# Altium footprint library chicken.PcbLib: 19 footprints (part 1 of 2)
Each footprint in its own frame and in the unit in brackets; x right, y up, seen from the top. Pads: shape width x height; smd on the part's side, far side on the other; paste and mask are expansions set on the pad; w line width, h text height; cw(c..) or ccw(c..) is an arc to the next point about the centre after c.
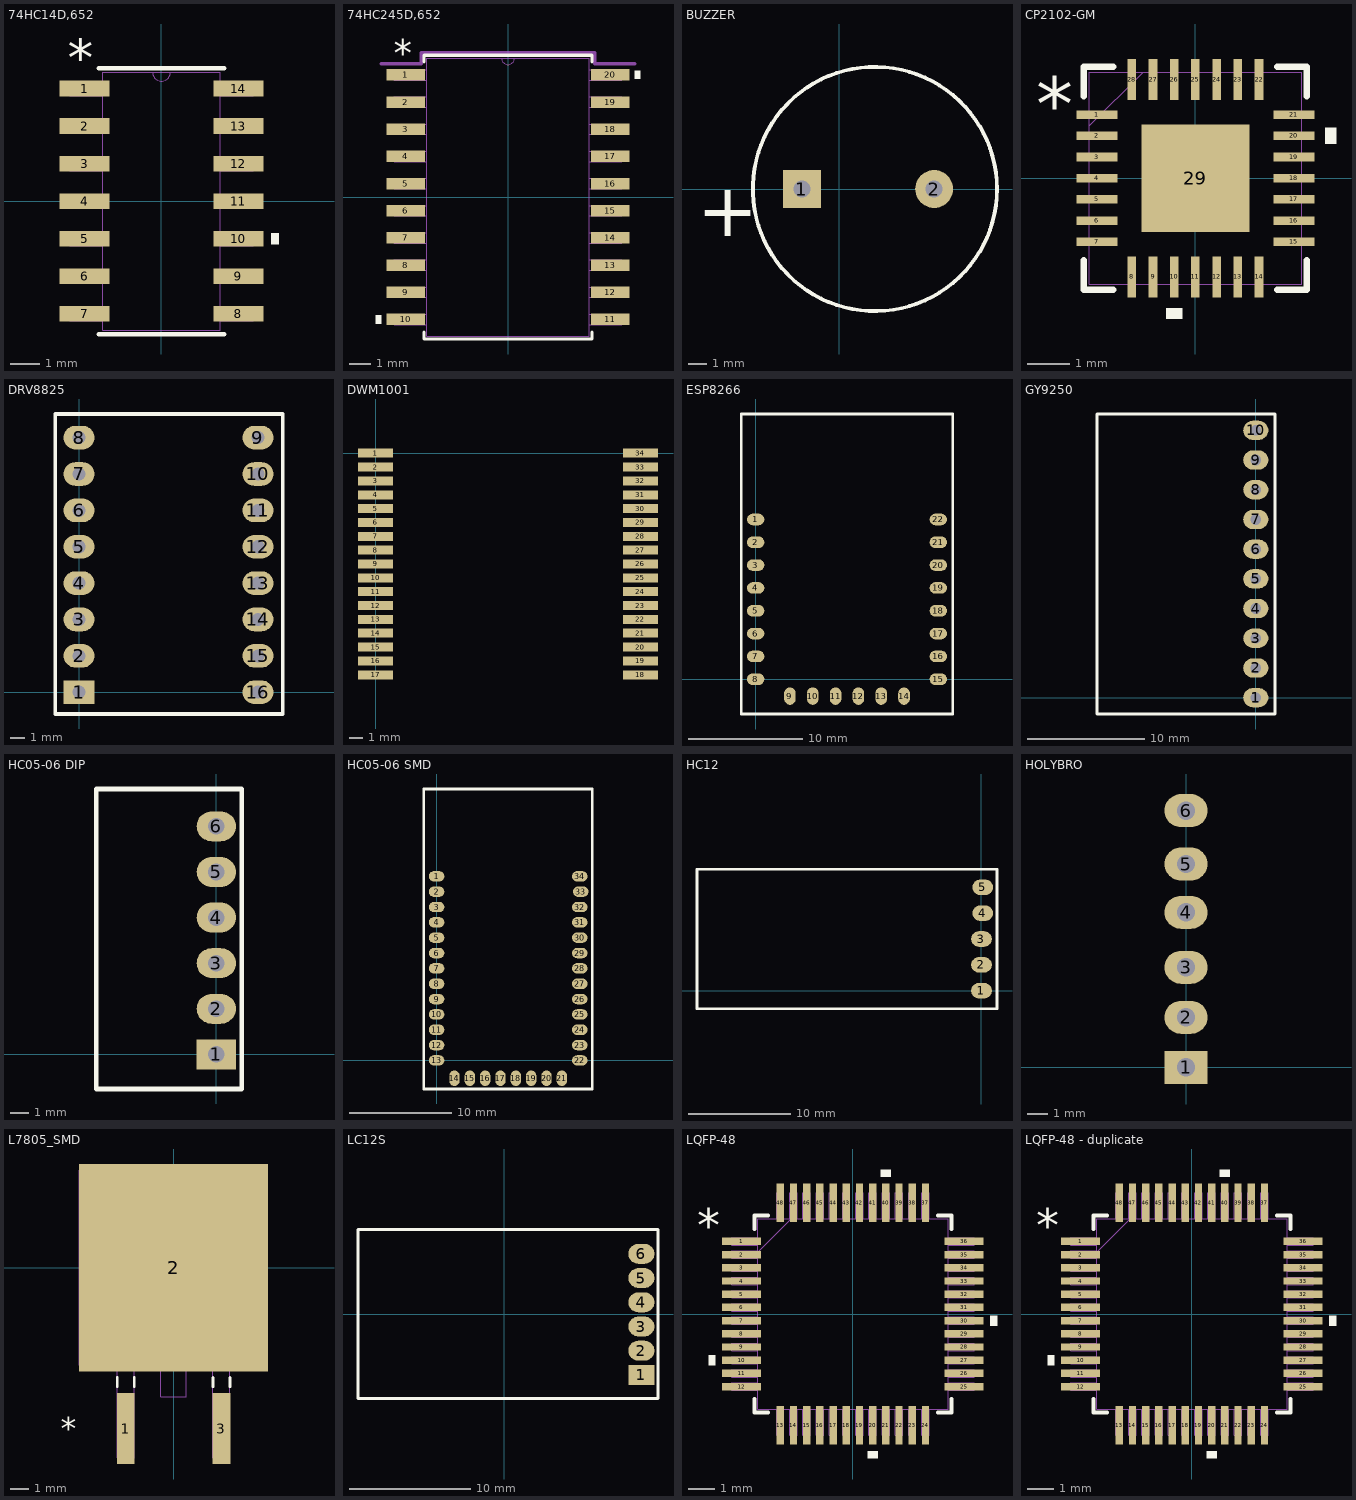
[diagram p0: the footprints below, top view; thin cyan lines are the x and y axes]

## 74HC14D,652 [mil]
pads (14):
  rect 67x21 smd paste+0 mask+0: 1(-102.5,150) 2(-102.5,100) 3(-102.5,50) 4(-102.5,0) 5(-102.5,-50) 6(-102.5,-100) 7(-102.5,-150) 8(102.5,-150) 9(102.5,-100) 10(102.5,-50) 11(102.5,0) 12(102.5,50) 13(102.5,100) 14(102.5,150)
Top Overlay:
  region: 146,-42.5 156,-42.5 156,-57.5 146,-57.5
  lines w6: -83.5,-177 83.5,-177 ; -83.5,177 83.5,177
  text "*" at -125,166 h50
Mechanical 13:
  lines w0: -12,172 ccw(c0,172) 12,172
  lines w1: -122,-159.5 -78.5,-159.5 -78.5,-140.5 -122,-140.5 -122,-159.5 ; -122,-109.5 -78.5,-109.5 -78.5,-90.5 -122,-90.5 -122,-109.5 ; -122,-59.5 -78.5,-59.5 -78.5,-40.5 -122,-40.5 -122,-59.5 ; -122,-9.5 -78.5,-9.5 -78.5,9.5 -122,9.5 -122,-9.5 ; -122,40.5 -78.5,40.5 -78.5,59.5 -122,59.5 -122,40.5 ; -122,90.5 -78.5,90.5 -78.5,109.5 -122,109.5 -122,90.5 ; -122,140.5 -78.5,140.5 -78.5,159.5 -122,159.5 -122,140.5 ; -78.5,-172 -78.5,172 78.5,172 78.5,-172 -78.5,-172 ; 78.5,-159.5 122,-159.5 122,-140.5 78.5,-140.5 78.5,-159.5 ; 78.5,-109.5 122,-109.5 122,-90.5 78.5,-90.5 78.5,-109.5 ; 78.5,-59.5 122,-59.5 122,-40.5 78.5,-40.5 78.5,-59.5 ; 78.5,-9.5 122,-9.5 122,9.5 78.5,9.5 78.5,-9.5 ; 78.5,40.5 122,40.5 122,59.5 78.5,59.5 78.5,40.5 ; 78.5,90.5 122,90.5 122,109.5 78.5,109.5 78.5,90.5 ; 78.5,140.5 122,140.5 122,159.5 78.5,159.5 78.5,140.5
  text "*" at -76,119 h50
3D body: height 10, standoff 0, extent 0,0 10,10
3D body "SOT108-1_NEX.step": height 69.09, standoff 0, extent -124.01,-172.01 120,172.01

## 74HC245D,652 [mil]
pads (20):
  rect 71x21 smd paste+0 mask+0: 1(-188,225) 2(-188,175) 3(-188,125) 4(-188,75) 5(-188,25) 6(-188,-25) 7(-188,-75) 8(-188,-125) 9(-188,-175) 10(-188,-225) 11(188,-225) 12(188,-175) 13(188,-125) 14(188,-75) 15(188,-25) 16(188,25) 17(188,75) 18(188,125) 19(188,175) 20(188,225)
Top Overlay:
  region: 233.5,232.5 243.5,232.5 243.5,217.5 233.5,217.5
  region: -233.5,-217.5 -243.5,-217.5 -243.5,-232.5 -233.5,-232.5
  lines w6: -154.5,-248.6 -154.5,-261 154.5,-261 154.5,-248.6 ; -154.5,248.6 -154.5,261 154.5,261 154.5,248.6
  text "*" at -210.5,241 h50
Mechanical 13:
  lines w0: -12,256 ccw(c0,256) 12,256
  lines w1: -209.5,-234.5 -149.5,-234.5 -149.5,-215.5 -209.5,-215.5 -209.5,-234.5 ; -209.5,-184.5 -149.5,-184.5 -149.5,-165.5 -209.5,-165.5 -209.5,-184.5 ; -209.5,-134.5 -149.5,-134.5 -149.5,-115.5 -209.5,-115.5 -209.5,-134.5 ; -209.5,-84.5 -149.5,-84.5 -149.5,-65.5 -209.5,-65.5 -209.5,-84.5 ; -209.5,-34.5 -149.5,-34.5 -149.5,-15.5 -209.5,-15.5 -209.5,-34.5 ; -209.5,15.5 -149.5,15.5 -149.5,34.5 -209.5,34.5 -209.5,15.5 ; -209.5,65.5 -149.5,65.5 -149.5,84.5 -209.5,84.5 -209.5,65.5 ; -209.5,115.5 -149.5,115.5 -149.5,134.5 -209.5,134.5 -209.5,115.5 ; -209.5,165.5 -149.5,165.5 -149.5,184.5 -209.5,184.5 -209.5,165.5 ; -209.5,215.5 -149.5,215.5 -149.5,234.5 -209.5,234.5 -209.5,215.5 ; -149.5,-256 -149.5,256 149.5,256 149.5,-256 -149.5,-256 ; 149.5,-234.5 209.5,-234.5 209.5,-215.5 149.5,-215.5 149.5,-234.5 ; 149.5,-184.5 209.5,-184.5 209.5,-165.5 149.5,-165.5 149.5,-184.5 ; 149.5,-134.5 209.5,-134.5 209.5,-115.5 149.5,-115.5 149.5,-134.5 ; 149.5,-84.5 209.5,-84.5 209.5,-65.5 149.5,-65.5 149.5,-84.5 ; 149.5,-34.5 209.5,-34.5 209.5,-15.5 149.5,-15.5 149.5,-34.5 ; 149.5,15.5 209.5,15.5 209.5,34.5 149.5,34.5 149.5,15.5 ; 149.5,65.5 209.5,65.5 209.5,84.5 149.5,84.5 149.5,65.5 ; 149.5,115.5 209.5,115.5 209.5,134.5 149.5,134.5 149.5,115.5 ; 149.5,165.5 209.5,165.5 209.5,184.5 149.5,184.5 149.5,165.5 ; 149.5,215.5 209.5,215.5 209.5,234.5 149.5,234.5 149.5,215.5
  text "*" at -147,203 h50
Mechanical 15:
  lines w6: -233.5,245.5 -159.5,245.5 -159.5,266 159.5,266 159.5,245.5 233.5,245.5
3D body: height 10, standoff 0, extent 0,0 10,10
3D body "SOT163-1_NEX.step": height 104.09, standoff 0, extent -209.48,-255.98 209.5,255.99

## BUZZER [mil]
pads (2):
  rect 80x80 hole 36: 1(-78.73,0)
  round 80 hole 36: 2(200,0)
Top Overlay:
  circle w8: c75,0 r257.39
  text ".Designator" at -39.55,-145.62 h45
  text "+" at -300,-100 h112.5
3D body "Buzzer.step": height 334.65, standoff -216.54, extent -176.22,-237.44 296.22,235

## CP2102-GM [mil]
pads (29):
  rect 38x8 smd paste+0 mask+0: 1(-91.5,59.06) 2(-91.5,39.37) 3(-91.5,19.68) 4(-91.5,0) 5(-91.5,-19.68) 6(-91.5,-39.37) 7(-91.5,-59.06) 15(91.5,-59.06) 16(91.5,-39.37) 17(91.5,-19.68) 18(91.5,0) 19(91.5,19.68) 20(91.5,39.37) 21(91.5,59.06)
  rect 8x38 smd paste+0 mask+0: 8(-59.06,-91.5) 9(-39.37,-91.5) 10(-19.68,-91.5) 11(0,-91.5) 12(19.68,-91.5) 13(39.37,-91.5) 14(59.06,-91.5) 22(59.06,91.5) 23(39.37,91.5) 24(19.68,91.5) 25(0,91.5) 26(-19.68,91.5) 27(-39.37,91.5) 28(-59.06,91.5)
  rect 100x100 smd paste-65.5 mask+0: 29(0,0)
Top Overlay:
  region: -12.19,-120.5 -27.18,-120.5 -27.18,-130.5 -12.19,-130.5
  region: 120.5,46.87 130.5,46.87 130.5,31.87 120.5,31.87
  lines w6: -103.5,-76.16 -103.5,-103.5 -76.16,-103.5 ; -103.5,76.16 -103.5,103.5 -76.16,103.5 ; 76.16,-103.5 103.5,-103.5 103.5,-76.16 ; 76.16,103.5 103.5,103.5 103.5,76.16
  text "*" at -148,43.9 h50
Top Paste:
  region: -3.94,50 -50,50 -50,3.94 -3.94,3.94
  region: -3.94,-3.94 -50,-3.94 -50,-50 -3.94,-50
  region: 50,50 3.94,50 3.94,3.94 50,3.94
  region: 50,-3.94 3.94,-3.94 3.94,-50 50,-50
Mechanical 13:
  lines w1: -98.5,48.5 -48.5,98.5 ; -98.5,-98.5 98.5,-98.5 98.5,98.5 -98.5,98.5 -98.5,-98.5 ; -98.5,-65.06 -98.5,-53.06 -98.5,-65.06 ; -98.5,-45.37 -98.5,-33.37 -98.5,-45.37 ; -98.5,-25.68 -98.5,-13.69 -98.5,-25.68 ; -98.5,-6 -98.5,6 -98.5,-6 ; -98.5,13.69 -98.5,25.68 -98.5,13.69 ; -98.5,33.37 -98.5,45.37 -98.5,33.37 ; -98.5,53.06 -98.5,65.06 -98.5,53.06 ; -65.06,-98.5 -53.06,-98.5 -65.06,-98.5 ; -65.06,98.5 -53.06,98.5 -65.06,98.5 ; -45.37,-98.5 -33.37,-98.5 -45.37,-98.5 ; -45.37,98.5 -33.37,98.5 -45.37,98.5 ; -25.68,-98.5 -13.69,-98.5 -25.68,-98.5 ; -25.68,98.5 -13.69,98.5 -25.68,98.5 ; -6,-98.5 6,-98.5 -6,-98.5 ; -6,98.5 6,98.5 -6,98.5 ; 13.69,-98.5 25.68,-98.5 13.69,-98.5 ; 13.69,98.5 25.68,98.5 13.69,98.5 ; 33.37,-98.5 45.37,-98.5 33.37,-98.5 ; 33.37,98.5 45.37,98.5 33.37,98.5 ; 53.06,-98.5 65.06,-98.5 53.06,-98.5 ; 53.06,98.5 65.06,98.5 53.06,98.5 ; 98.5,-65.06 98.5,-53.06 98.5,-65.06 ; 98.5,-45.37 98.5,-33.37 98.5,-45.37 ; 98.5,-25.68 98.5,-13.69 98.5,-25.68 ; 98.5,-6 98.5,6 98.5,-6 ; 98.5,13.69 98.5,25.68 98.5,13.69 ; 98.5,33.37 98.5,45.37 98.5,33.37 ; 98.5,53.06 98.5,65.06 98.5,53.06
  text "*" at -85,43.9 h50
3D body "QFN28_5X5_SIL.step": height 37.09, standoff 0, extent -98.5,-98.5 98.51,98.51
3D body: height 10, standoff 0, extent 0,0 10,10

## DRV8825 [mil]
pads (16):
  rect 85x65 hole 36: 1(0,0)
  oval 85x65 hole 36: 2(0,100) 3(0,200) 4(0,300) 5(0,400) 6(0,500) 7(0,600) 8(0,700) 9(492.13,700) 10(492.13,600) 11(492.13,500) 12(492.13,400) 13(492.13,300) 14(492.13,200) 15(492.13,100) 16(492.13,0)
Top Overlay:
  lines w10: -65,-60 560,-60 560,765 -65,765 -65,-60
3D body "Driver DRV8825.stp": height 500, standoff -80.46, extent -50.27,-47.36 540.28,752.64

## DWM1001 [mm]
pads (34):
  rect 2.54x0.65 smd: 1(0,0) 2(0,-1) 3(0,-2) 4(0,-3) 5(0,-4) 6(0,-5) 7(0,-6) 8(0,-7) 9(0,-8) 10(0,-9) 11(0,-10) 12(0,-11) 13(0,-12) 14(0,-13) 15(0,-14) 16(0,-15) 17(0,-16) 18(19.13,-16) 19(19.13,-15) 20(19.13,-14) 21(19.13,-13) 22(19.13,-12) 23(19.13,-11) 24(19.13,-10) 25(19.13,-9) 26(19.13,-8) 27(19.13,-7) 28(19.13,-6) 29(19.13,-5) 30(19.13,-4) 31(19.13,-3) 32(19.13,-2) 33(19.13,-1) 34(19.13,0)
3D body "dwm1001 v2.step": height 3.2, standoff 0, extent -0.04,-17.124 19.09,8.996

## ESP8266 [mil]
pads (22):
  oval 60x40 smd: 1(0,551.18) 2(0,472.44) 3(0,393.7) 4(0,314.96) 5(0,236.22) 6(0,157.48) 7(0,78.74) 8(0,0) 15(629.92,0) 16(629.92,78.74) 17(629.92,157.48) 18(629.92,236.22) 19(629.92,314.96) 20(629.92,393.7) 21(629.92,472.44) 22(629.92,551.18)
  oval 40x60 smd: 9(118.11,-58.27) 10(196.85,-58.27) 11(275.59,-58.27) 12(354.33,-58.27) 13(433.07,-58.27) 14(511.81,-58.27)
Top Overlay:
  lines w10: -50,-120 680,-120 680,915 -25,915 -50,915 -50,-120
3D body "EPS8266 ESP-12F.STEP": height 104.33, standoff -1.38, extent -5.16,-62.63 625.16,882.44

## GY9250 [mil]
pads (10):
  oval 85x65 hole 36: 1(0,0) 2(0,100) 3(0,200) 4(0,300) 5(0,400) 6(0,500) 7(0,600) 8(0,700) 9(0,800) 10(0,900)
Top Overlay:
  lines w10: -535,-55 -535,955 65,955 65,-55 -535,-55
3D body "MPU-9250.stp": height 266.97, standoff -235.99, extent -530.28,-50 60.28,950

## HC05-06 DIP [mil]
pads (6):
  rect 85x65 hole 36: 1(0,0)
  oval 85x65 hole 36: 2(0,98.82) 3(0,197.64) 4(0,296.46) 5(0,395.28) 6(0,494.09)
Top Overlay:
  lines w10: -260,-75 -260,565 -260,575 30,575 55,575 55,-75 -260,-75
3D body "HC-05.STEP": height 1633.86, standoff -42.65, extent -247.87,-64.96 10,564.96

## HC05-06 SMD [mil]
pads (34):
  oval 60x40 smd: 1(0,708.66) 2(0,649.61) 3(0,590.55) 4(0,531.5) 5(0,472.44) 6(0,413.39) 7(0,354.33) 8(0,295.28) 9(0,236.22) 10(0,177.17) 11(0,118.11) 12(0,59.06) 13(0,0) 22(551.18,0) 23(551.18,59.06) 24(551.18,118.11) 25(551.18,177.17) 26(551.18,236.22) 27(551.18,295.28) 28(551.18,354.33) 29(551.18,413.39) 30(551.18,472.44) 31(551.18,531.5) 32(551.18,590.55) 33(555,649.61) 34(551.18,708.66)
  oval 40x60 smd: 14(68.9,-68.9) 15(127.95,-68.9) 16(187.01,-68.9) 17(246.06,-68.9) 18(305.12,-68.9) 19(364.17,-68.9) 20(423.23,-68.9) 21(482.28,-68.9)
Top Overlay:
  lines w10: -50,-110 600,-110 600,-100 600,1045 -25,1045 -50,1045 -50,-110
3D body "Bluetooth HC-06_.STEP": height 92.52, standoff 0, extent 0,-70 551.97,1032.76

## HC12 [mil] "HC12"
pads (5):
  oval 80x60 smd: 1(0,0) 2(0,100) 3(0,200) 4(5,300) 5(5,400)
Top Overlay:
  lines w10: -1100,-70 60,-70 60,470 -1100,470 -1100,-70
3D body "HC-12 SI4463 WIRELESS SERIAL MODULE.STEP": height 1019.68, standoff 0, extent -1090.46,-61.81 0,461.81

## HOLYBRO [mil]
pads (6):
  rect 85x65 hole 36: 1(0,0)
  oval 85x65 hole 36: 2(0,98.43) 3(0,196.85) 4(0,305) 5(0,400) 6(0,505)
3D body "JST - XH - Thru (V) - 6Pin - 2.54mm.stp": height 303.69, standoff -98.31, extent -135,-87 95,597

## L7805_SMD [mil]
pads (3):
  rect 39x154 smd paste+0 mask+0: 1(-103.94,-349.5) 3(103.94,-349.5)
  rect 411x451 smd paste+0 mask+0: 2(0,0)
Top Overlay:
  lines w6: -122.44,-258.5 -122.44,-238.6 ; -85.44,-258.5 -85.44,-238.6 ; 85.44,-258.5 85.44,-238.6 ; 122.44,-258.5 122.44,-238.6
  text "*" at -245.37,-374.5 h50
Mechanical 13:
  lines w1: -27.5,-211.5 -27.5,-280.5 27.5,-280.5 27.5,-211.5 ; -204.5,-211.5 -204.5,211.5 204.5,211.5 204.5,-211.5 -204.5,-211.5 ; -122.44,-412.5 -85.44,-412.5 -85.44,-211.5 -122.44,-211.5 -122.44,-412.5 ; 85.44,-412.5 122.44,-412.5 122.44,-211.5 85.44,-211.5 85.44,-412.5
  text "*" at -116.44,-226.5 h50
3D body "D2PAK_STM.step": height 185.04, standoff 1.93, extent -205,-320.31 203.98,210.31
3D body: height 10, standoff 0, extent 0,0 10,10

## LC12S [mil]
pads (6):
  rect 85x65 smd: 1(446.22,-198.11)
  oval 85x65 smd: 2(446.22,-119.37) 3(446.22,-40.63) 4(446.22,38.11) 5(446.22,116.85) 6(446.22,195.59)
Top Overlay:
  lines w10: -475,-275 -475,275 500,275 500,-275 -475,-275
3D body "LC12S.STEP": height 78.74, standoff 0, extent -473.31,-268.08 444.01,271.3

## LQFP-48 [mil]
pads (48):
  rect 58x11 smd: 1(-166,108.27) 2(-166,88.58) 3(-166,68.9) 4(-166,49.21) 5(-166,29.53) 6(-166,9.84) 7(-166,-9.84) 8(-166,-29.53) 9(-166,-49.21) 10(-166,-68.9) 11(-166,-88.58) 12(-166,-108.27) 25(166,-108.27) 26(166,-88.58) 27(166,-68.9) 28(166,-49.21) 29(166,-29.53) 30(166,-9.84) 31(166,9.84) 32(166,29.53) 33(166,49.21) 34(166,68.9) 35(166,88.58) 36(166,108.27)
  rect 11x58 smd: 13(-108.27,-166) 14(-88.58,-166) 15(-68.9,-166) 16(-49.21,-166) 17(-29.53,-166) 18(-9.84,-166) 19(9.84,-166) 20(29.53,-166) 21(49.21,-166) 22(68.9,-166) 23(88.58,-166) 24(108.27,-166) 37(108.27,166) 38(88.58,166) 39(68.9,166) 40(49.21,166) 41(29.53,166) 42(9.84,166) 43(-9.84,166) 44(-29.53,166) 45(-49.21,166) 46(-68.9,166) 47(-88.58,166) 48(-108.27,166)
Top Overlay:
  region: 56.71,205 41.71,205 41.71,215 56.71,215
  region: 205,-2.34 215,-2.34 215,-17.34 205,-17.34
  region: 37.03,-205 22.03,-205 22.03,-215 37.03,-215
  region: -205,-61.4 -215,-61.4 -215,-76.4 -205,-76.4
  lines w6: -147,-126.87 -147,-147 -126.87,-147 ; -147,126.87 -147,147 -126.87,147 ; 126.87,-147 147,-147 147,-126.87 ; 126.87,147 147,147 147,126.87
  text "*" at -232.5,108.11 h50
Mechanical 13:
  drawing of 197 lines, arcs and shapes, not listed
  text "*" at -139.5,93.11 h50
3D body "LQFP-48.step": height 63.11, standoff 0, extent -180.98,-180.98 180.99,180.99
3D body: height 10, standoff 0, extent 0,0 10,10

## LQFP-48 - duplicate [mil]
pads (48):
  rect 58x11 smd: 1(-166,108.27) 2(-166,88.58) 3(-166,68.9) 4(-166,49.21) 5(-166,29.53) 6(-166,9.84) 7(-166,-9.84) 8(-166,-29.53) 9(-166,-49.21) 10(-166,-68.9) 11(-166,-88.58) 12(-166,-108.27) 25(166,-108.27) 26(166,-88.58) 27(166,-68.9) 28(166,-49.21) 29(166,-29.53) 30(166,-9.84) 31(166,9.84) 32(166,29.53) 33(166,49.21) 34(166,68.9) 35(166,88.58) 36(166,108.27)
  rect 11x58 smd: 13(-108.27,-166) 14(-88.58,-166) 15(-68.9,-166) 16(-49.21,-166) 17(-29.53,-166) 18(-9.84,-166) 19(9.84,-166) 20(29.53,-166) 21(49.21,-166) 22(68.9,-166) 23(88.58,-166) 24(108.27,-166) 37(108.27,166) 38(88.58,166) 39(68.9,166) 40(49.21,166) 41(29.53,166) 42(9.84,166) 43(-9.84,166) 44(-29.53,166) 45(-49.21,166) 46(-68.9,166) 47(-88.58,166) 48(-108.27,166)
Top Overlay:
  region: -205,-61.4 -215,-61.4 -215,-76.4 -205,-76.4
  region: 37.03,-205 22.03,-205 22.03,-215 37.03,-215
  region: 205,-2.34 215,-2.34 215,-17.34 205,-17.34
  region: 56.71,205 41.71,205 41.71,215 56.71,215
  lines w6: -147,-126.87 -147,-147 -126.87,-147 ; -147,126.87 -147,147 -126.87,147 ; 126.87,-147 147,-147 147,-126.87 ; 126.87,147 147,147 147,126.87
  text "*" at -232.5,108.11 h50
Mechanical 13:
  drawing of 197 lines, arcs and shapes, not listed
  text "*" at -139.5,93.11 h50
3D body: height 10, standoff 0, extent 0,0 10,10